# Altium footprint library My Footprint.PcbLib: 268 footprints (part 2 of 17)
Each footprint in its own frame and in the unit in brackets; x right, y up, seen from the top. Pads: shape width x height; smd on the part's side, far side on the other; paste and mask are expansions set on the pad; w line width, h text height; cw(c..) or ccw(c..) is an arc to the next point about the centre after c.
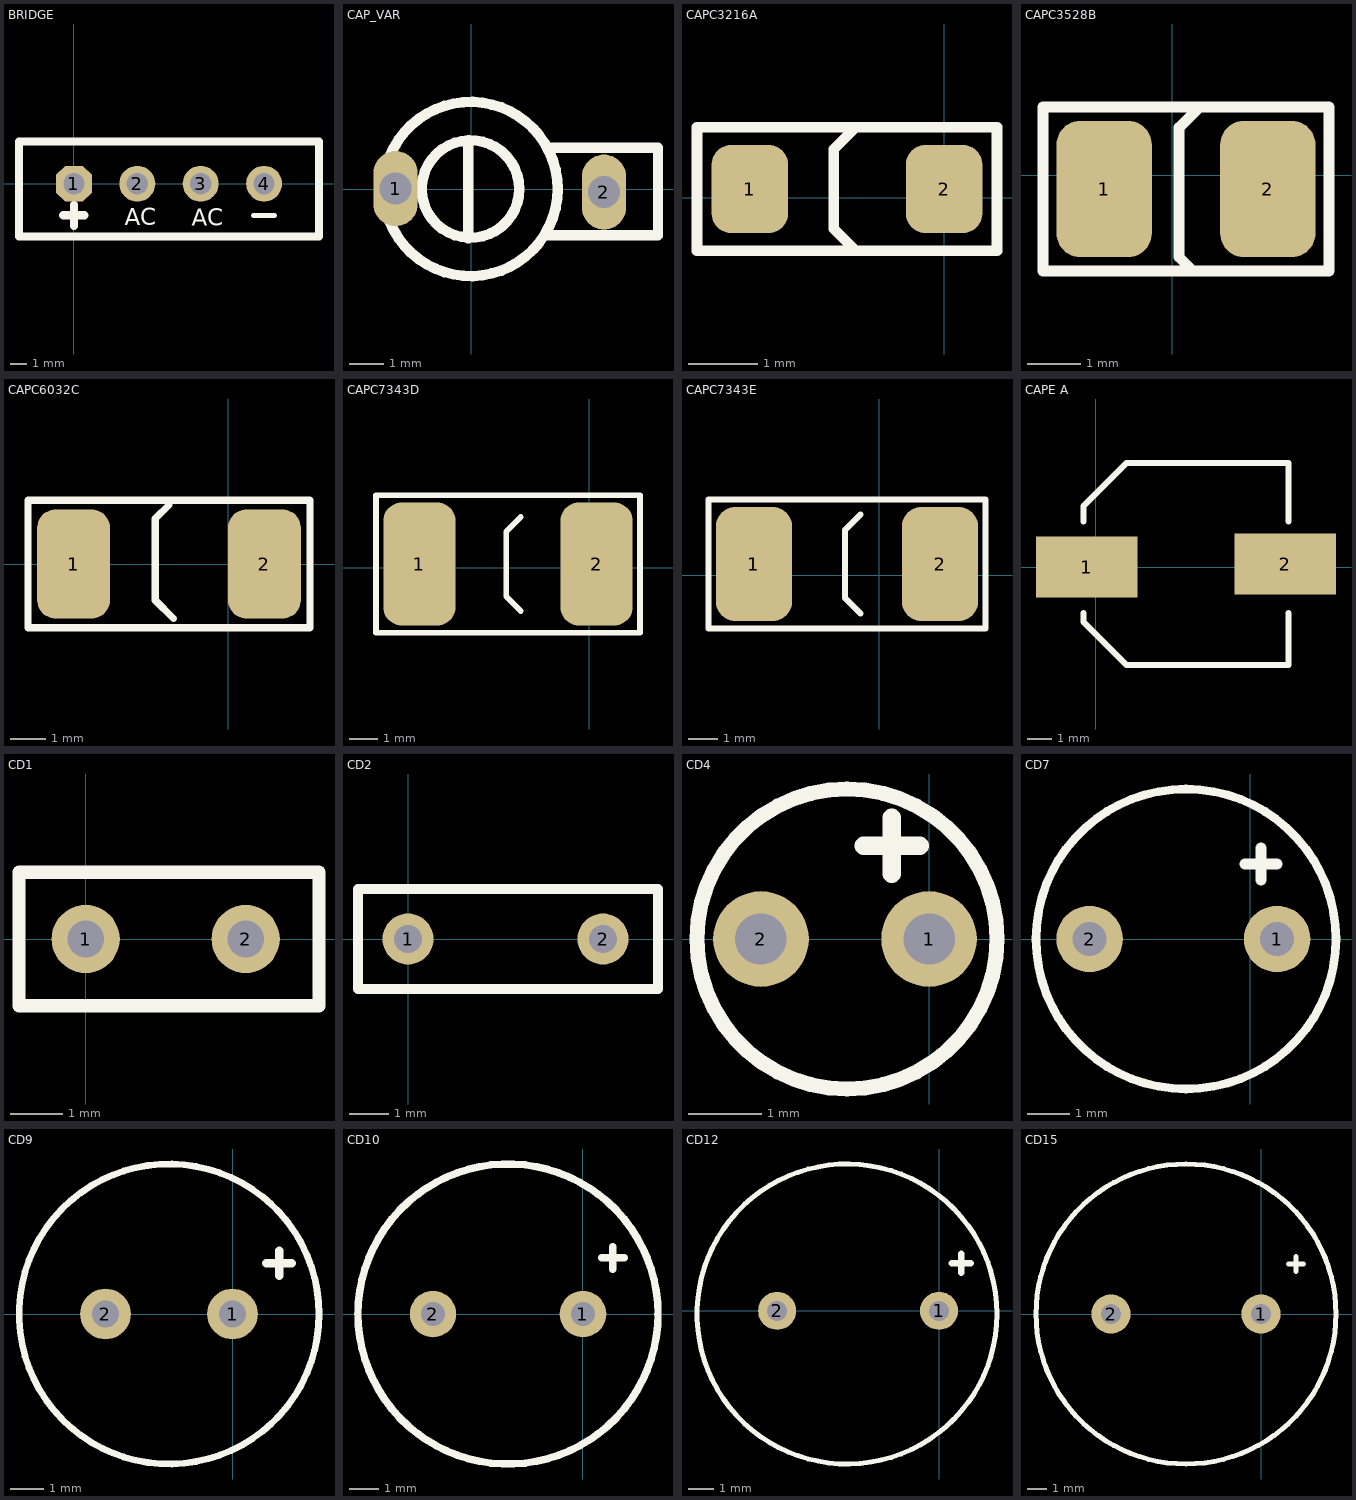
[diagram p1: the footprints below, top view; thin cyan lines are the x and y axes]

## BRIDGE [mil]
pads (4):
  oct 85x85 hole 50: 1(0,0)
  round 85 hole 50: 2(150,0) 3(300,0) 4(450,0)
Top Overlay:
  lines w12: 425,-75 475,-75
  lines w19.68: -25,-75 25,-75 ; 0,-100 0,-50 ; -130,-125 580,-125 580,100 -130,100 -130,-125
  text "AC" at 278.74,-100 h40
  text "AC" at 120.08,-98.82 h40
3D body "BRIDGE KBPM.STEP": height 452.76, standoff -500, extent -58.98,-110 515,87.24

## CAP_VAR [mil]
pads (2):
  oval 50x85 hole 36: 1(-85.43,0.79) 2(150,-3.15)
Top Overlay:
  circle w11.81: c-0.79,0.39 r55.12
  circle w11.81: c-0.79,0.39 r98.43
  lines w11.81: -3.15,-55.12 -3.15,53.94 ; 87.4,-51.97 211.02,-51.97 ; 89.76,47.24 210.24,47.24 ; 211.02,-51.57 211.02,46.85

## CAPC3216A [mil]
pads (2):
  rrect50% 43.31x50 smd: 1(-110,5) 2(0,5)
Top Overlay:
  lines w6: -50,-30 -62.5,-17.5 -62.5,27.5 -50,40 ; -140,-30 -140,40 30,40 30,-30 -140,-30
3D body "TAJ-A.STEP": height 62.99, standoff 0, extent -117.97,-26.48 8.01,36.52

## CAPC3528B [mil]
pads (2):
  rrect50% 70x100 smd: 1(-50,-10) 2(70,-10)
Top Overlay:
  lines w8: 15,-70 5,-60 5,35 20,50 ; -95,-70 -95,50 115,50 115,-70 -95,-70
3D body "TAJ-B.STEP": height 74.8, standoff 0, extent -58.89,-65.12 78.9,45.12

## CAPC6032C [mil]
pads (2):
  rrect50% 80x120 smd: 1(-170,0) 2(40,0)
Top Overlay:
  lines w8: -65,65 -80,50 -80,-40 -60,-60 ; -220,-70 -220,70 90,70 90,-70 -220,-70
3D body "TAJ-C.STEP": height 102.36, standoff 0, extent -183.11,-62.99 53.11,63

## CAPC7343D [mil]
pads (2):
  rrect50% 100x170 smd: 1(-235,5) 2(10,5)
Top Overlay:
  lines w8: -95,-60 -115,-40 -115,50 -95,70 ; -295,-90 -295,100 70,100 70,-90 -295,-90
3D body "TAJ-D.STEP": height 114.17, standoff 0, extent -258.7,-79.64 28.7,89.65

## CAPC7343E [mil]
pads (2):
  rrect50% 100x150 smd: 1(-165,15) 2(80,15)
Top Overlay:
  lines w8: -25,-50 -45,-30 -45,60 -25,80 ; -225,-70 -225,100 140,100 140,-70 -225,-70
3D body "TAJ-E.STEP": height 161.42, standoff 0, extent -188.7,-69.29 98.7,100

## CAPE A [mil] "固态电容"
pads (2):
  rect 166x100 smd: 1(-15,0) 2(310,5)
Top Overlay:
  lines w10: -20,-75 -20,-90 50,-160 315,-160 315,-75 ; -20,75 -20,100 50,170 315,170 315,75
3D body "CAPE-F.STEP": height 401.77, standoff -0.2, extent -49.88,-158.39 339.88,168.38

## CD1 [mm] "瓷片、独石"
pads (2):
  round 1.3 hole 0.7: 1(0,0) 2(3.048,0)
Top Overlay:
  lines w0.254: -1.27,-1.27 -1.27,1.27 4.445,1.27 4.445,-1.27 -1.27,-1.27
3D body "Cap 0_2in pitch.STEP": height 5.5, standoff -3.33, extent -1.226,-1.377 4.274,1.123

## CD2 [mm] "CBB"
pads (2):
  round 1.3 hole 0.7: 1(0,0) 2(4.953,0)
Top Overlay:
  lines w0.254: -1.27,-1.27 -1.27,1.27 6.35,1.27 6.35,-1.27 -1.27,-1.27

## CD4 [mm] "1uF50V大小"
pads (2):
  round 1.3 hole 0.7: 1(0,0) 2(-2.286,0)
Top Overlay:
  circle w0.203: c-1.116,0 r2.04
  lines w0.254: -0.889,1.27 -0.127,1.27 ; -0.508,0.889 -0.508,1.651
3D body "CAP PR2.0x5x11mm.STEP": height 11.53, standoff -3.27, extent -3.668,-2.525 1.382,2.525

## CD7 [mil] "680uF容值以下耐压25V"
pads (2):
  round 62 hole 31.5: 1(25,0) 2(-150,0)
Top Overlay:
  circle w8: c-60,0 r140
  lines w10: -5,70 25,70 ; 10,55 10,85
3D body "CAP PR3.5x8x11.5mm.STEP": height 473.44, standoff -136.91, extent -218.48,-160 98.48,156.96

## CD9 [mil] "1000uF电容25V左右"
pads (2):
  round 60 hole 31.5: 1(0,0) 2(-150,0)
Top Overlay:
  circle w7.87: c-75,0 r177.16
  lines w10: 40,60 70,60 ; 55,45 55,75
3D body "CAP PR5.0x10x12.5mm.STEP": height 512.81, standoff -136.91, extent -272.85,-197.85 122.85,197.85

## CD10 [mil] "1000uF35V耐压"
pads (2):
  round 62 hole 31.5: 1(0,0) 2(-200,0)
Top Overlay:
  circle w10: c-100,0 r200
  lines w10: 25,75 55,75 ; 40,60 40,90

## CD12 [mil] "2200uF 及以上35V以上耐压"
pads (2):
  round 60 hole 31.5: 1(0,0) 2(-255,0)
Top Overlay:
  circle w7.87: c-145,-5 r236.22
  lines w10: 20,75 50,75 ; 35,60 35,90
3D body "Capacitor 2200uF, 25V.step": height 1000, standoff -1131.89, extent -399.84,-270 119.84,249.69

## CD15 [mm]
pads (2):
  round 2 hole 1: 1(0,0) 2(-7.62,0)
Top Overlay:
  circle w0.254: c-3.81,0 r7.62
  lines w0.254: 1.397,2.54 2.159,2.54 ; 1.778,2.159 1.778,2.921